# Altium integrated library Lib_MS_V4.0.IntLib: 296 symbols (part 1 of 2) (continued)
## IC_STM32H747IIT6 (continued)
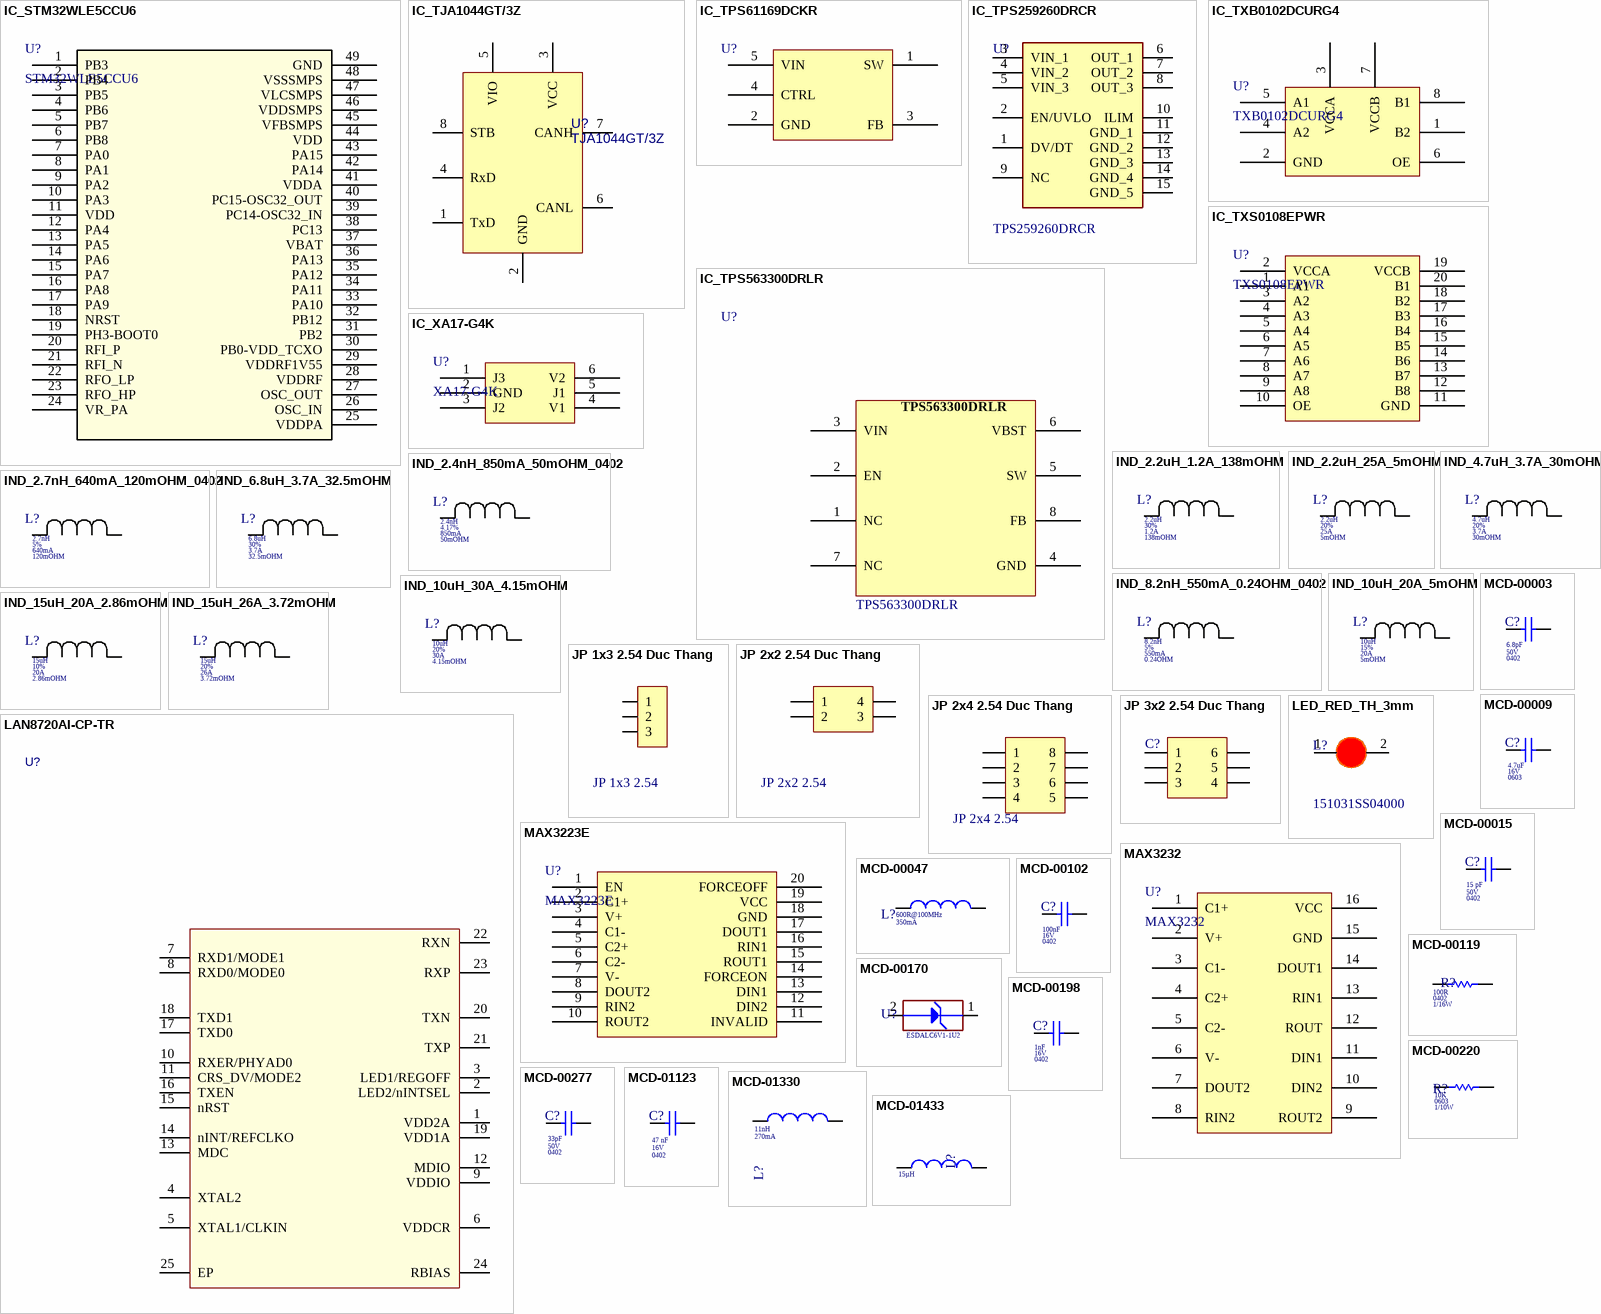
[diagram p5: symbols IC_STM32WLE5CCU6 to MCD-01433]

## IC_STM32WLE5CCU6
designator U?, comment STM32WLE5CCU6
IC RF TXRX+MCU 802.15.4 48UFQFPN; Sort: MCU; ComponentLink1Description: Link; ComponentLink1URL: https://www.digikey.bg/en/products/detail/stmicroelectronics/STM32WLE5CCU6/13557445; Datasheet: https://www.mouser.vn/datasheet/2/389/stm32wle5c8-1903151.pdf; Package: 48UFQFPN
footprint IC_STM32WLE5CCU6
pins: 1 PB3, 2 PB4, 3 PB5, 4 PB6, 5 PB7, 6 PB8, 7 PA0, 8 PA1, 9 PA2, 10 PA3, 11 VDD, 12 PA4, 13 PA5, 14 PA6, 15 PA7, 16 PA8, 17 PA9, 18 NRST, 19 PH3-BOOT0, 20 RFI_P, 21 RFI_N, 22 RFO_LP, 23 RFO_HP, 24 VR_PA, 25 VDDPA, 26 OSC_IN, 27 OSC_OUT, 28 VDDRF, 29 VDDRF1V55, 30 PB0-VDD_TCXO, 31 PB2, 32 PB12, 33 PA10, 34 PA11, 35 PA12, 36 PA13, 37 VBAT, 38 PC13, 39 PC14-OSC32_IN, 40 PC15-OSC32_OUT, 41 VDDA, 42 PA14, 43 PA15, 44 VDD, 45 VFBSMPS, 46 VDDSMPS, 47 VLCSMPS, 48 VSSSMPS, 49 GND

## IC_TJA1044GT/3Z
designator U?, comment TJA1044GT/3Z
1/1 Transceiver Half CANbus 8-SO; Manufacturer: ON Semiconductor; Point: 8; Description SEL: IC TRANSCEIVER HALF 1/1 8SO; Part Number: TJA1044GT/3Z; ComponentLink1Description: DIGIKEY; ComponentLink1URL: https://www.digikey.bg/en/products/detail/nxp-usa-inc/TJA1044GT-3Z/7648357?s=N4IgTCBcDaICoCkCCBGADAFgwcTgegGYAtEAXQF8g; Sort: TRANSCEIVER; Package: 8-SOIC
footprint IC_TJA1044GT/3Z
pins: 1 TxD, 2 GND, 3 VCC, 4 RxD, 5 VIO, 6 CANL, 7 CANH, 8 STB

## IC_TPS61169DCKR
designator U?, comment TPS61169DCKR  (value not drawn)
IC LED DRV RGLTR PWM 1.8A SC70-5; Sort: LED DRV; ComponentLink1Description: New link; ComponentLink1URL: https://www.digikey.bg/en/products/detail/texas-instruments/TPS61169DCKR/5048578?s=N4IgTCBcDaIC4AcDOA2AjGlBOAJgYwGsAnEAXQF8g; Package: SC70-5
footprint IC_TPS61169DCKR - duplicate
pins: 1 SW, 2 GND, 3 FB, 4 CTRL, 5 VIN

## IC_TPS259260DRCR
designator U?, comment TPS259260DRCR
IC ELECTRONIC FUSE 15% 10VSON; ComponentLink1Description: New link; ComponentLink1URL: https://www.digikey.bg/en/products/detail/texas-instruments/TPS259260DRCR/5481851?s=N4IgTCBcDaICoAUDKYCsBOMA2ADAEQCUBhAkAXQF8g; Sort: ELECTRONIC FUSE; Package: 10VSON
footprint IC_TPS259260DRCR
pins: 1 DV/DT, 2 EN/UVLO, 3 VIN_1, 4 VIN_2, 5 VIN_3, 6 OUT_1, 7 OUT_2, 8 OUT_3, 9 NC, 10 ILIM, 11 GND_1, 12 GND_2, 13 GND_3, 14 GND_4, 15 GND_5

## IC_TPS563300DRLR
designator U?, comment TPS563300DRLR
IC REG BUCK ADJ 3A SOT583; Manufacture 1: Texas Instruments; Mouting Type: SMD; Packing: Reel; MSL: 1; Package: SOT-583; Sort: IC REG BUCK; Temperature: -40°C ~ 150°C; ComponentLink1Description: New link; ComponentLink1URL: https://www.digikey.com/en/products/detail/texas-instruments/TPS563300DRLR/16669318?s=N4IgTCBcDaICoAUDKBWAbAZgwBmwEQCUAZAkAXQF8g; Type: REG BUCK; Manufacture Part Number 1: TPS563300DRLR
footprint IC_TPS563300DRLR
pins: 1 NC, 2 EN, 3 VIN, 4 GND, 5 SW, 6 VBST, 7 NC, 8 FB

## IC_TXB0102DCURG4
designator U?, comment TXB0102DCURG4
IC TRANSLTR BIDIRECTIONAL 8VSSOP; ComponentLink1Description: New link; ComponentLink1URL: https://linhkien.cxtvn.com/6065-txb0102dcur-ic-trnsltr-bidirectional-8-vssop.html; ComponentLink2Description: New link 1; ComponentLink2URL: https://www.digikey.com/en/products/detail/texas-instruments/TXB0102DCURG4/1910148; Sort: TRANSLTR BIDIRECTIONAL; Package: 8VSSOP
footprint IC_TXB0102DCURG4
pins: 1 B2, 2 GND, 3 VCCA, 4 A2, 5 A1, 6 OE, 7 VCCB, 8 B1

## IC_TXS0108EPWR
designator U?, comment TXS0108EPWR
IC TRANSLATOR BIDIR 20TSSOP; ComponentLink1Description: New link; ComponentLink1URL: https://linhkien.cxtvn.com/5101-txs0108epwr-ic-translator-bidirectional-60mbps-20-tssop.html; ComponentLink2Description: New link 1; ComponentLink2URL: https://www.digikey.com/en/products/detail/texas-instruments/TXS0108EPWR/1775302; Sort: TRANSLATOR BIDIR; Package: 20TSSOP
footprint IC_TXS0108EPWR
pins: 1 A1, 2 VCCA, 3 A2, 4 A3, 5 A4, 6 A5, 7 A6, 8 A7, 9 A8, 10 OE, 11 GND, 12 B8, 13 B7, 14 B6, 15 B5, 16 B4, 17 B3, 18 B2, 19 VCCB, 20 B1

## IC_XA17-G4K
designator U?, comment XA17-G4K
20MHz~4GHz 25dB 0.7dB SOT-363 RF Switches ROHS; ComponentLink1Description: LCSC; ComponentLink1URL: https://www.lcsc.com/product-detail/RF-Switches_XINLUDA-XA17-G4K_C513494.html; Sort: RF Switch; Package: SOT-363
footprint IC_XA17-G4K
pins: 1 J3, 2 GND, 3 J2, 4 V1, 5 J1, 6 V2

## IND_2.2uH_1.2A_138mOHM
designator L?, comment DCR: 138mOHM  Current: 1.2A  Tolerance: 30%  Inductance: 2.2uH  (hidden comment: LQM2MPN2R2NG0L)
2.2 µH Shielded Multilayer Inductor 1.2 A 138mOhm Max 0806 (2016 Metric); ComponentLink1Description: DIGIKEY; ComponentLink1URL: https://www.digikey.com/en/products/detail/murata-electronics/LQM2MPN2R2NG0L/4358099?s=N4IgTCBcDaIDIEUCyYkAUByYBKYMHEAGEAXQF8g
footprint IND_LQM2MPN2R2NG0L
pins: 1, 2

## IND_2.2uH_25A_5mOHM
designator L?, comment DCR: 5mOHM  Current: 25A  Tolerance: 20%  Inductance: 2.2uH  (hidden comment: NRS8040T6R8NJGJ)
2.2 µH Shielded Wirewound Inductor 25 A 5mOhm Max Nonstandard; ComponentLink1Description: DIGIKEY; ComponentLink1URL: https://www.digikey.com/en/products/detail/bourns-inc/SRP1245CC-2R2M/21263788
footprint IND_SRP1245CC-2R2M
pins: 1, 2

## IND_2.4nH_850mA_50mOHM_0402
designator L?, comment DCR: 50mOHM  Current: 850mA  Tolerance: 4.17%  Inductance: 2.4nH  (hidden comment: LQW15AN2N4B00D)
2.4 nH Unshielded Drum Core, Wirewound Inductor 850 mA 50mOhm Max 0402 (1005 Metric); ComponentLink1Description: New link; ComponentLink1URL: https://www.digikey.com/en/products/detail/murata-electronics/LQW15AN2N4B00D/2594882
footprint IND_0402
pins: 1, 2

## IND_2.7nH_640mA_120mOHM_0402
designator L?, comment DCR: 120mOHM  Current: 640mA  Tolerance: 5%  Inductance: 2.7nH  (hidden comment: CS0402-2N7J-S)
640mA 2.7nH ±5% 120mΩ 0402 Inductors (SMD) ROHS; ComponentLink1Description: New link; ComponentLink1URL: https://www.lcsc.com/product-detail/Inductors-SMD_Chilisin-Elec-CS0402-2N7J-S_C142181.html
footprint IND_0402
pins: 1, 2

## IND_4.7uH_3.7A_30mOHM
designator L?, comment DCR: 30mOHM  Current: 3.7A  Tolerance: 20%  Inductance: 4.7uH  (hidden comment: SDR0805-4R7ML)
4.7 µH Unshielded Drum Core, Wirewound Inductor 3.7 A 30mOhm Max Nonstandard; ComponentLink1Description: New link; ComponentLink1URL: https://www.digikey.com/en/products/detail/bourns-inc/SDR0805-4R7ML/2352815
footprint SDR0805-4R7ML
pins: 1, 2

## IND_6.8uH_3.7A_32.5mOHM
designator L?, comment DCR: 32.5mOHM  Current: 3.7A  Tolerance: 30%  Inductance: 6.8uH  (hidden comment: NRS8040T6R8NJGJ)
6.8 µH Shielded Drum Core, Wirewound Inductor 3.7 A 32.5mOhm Max Nonstandard; ComponentLink1Description: New link; ComponentLink1URL: https://www.digikey.gr/en/products/detail/taiyo-yuden/NRS8040T6R8NJGJ/2666017
footprint IND_8x8x4
pins: 1, 2

## IND_8.2nH_550mA_0.24OHM_0402
designator L?, comment DCR: 0.24OHM  Current: 550mA  Tolerance: 5%  Inductance: 8.2nH  (hidden comment: LQG15HS8N2J02D)
8.2 nH Unshielded Multilayer Inductor 550 mA 240mOhm Max 0402 (1005 Metric); ComponentLink1Description: New link; ComponentLink1URL: https://www.digikey.com/en/products/detail/murata-electronics/LQG15HS8N2J02D/662871
footprint IND_0402
pins: 1, 2

## IND_10uH_20A_5mOHM
designator L?, comment DCR: 5mOHM  Current: 20A  Tolerance: 15%  Inductance: 10uH  (hidden comment: HCTI-10-20.0)
10 µH Shielded Toroidal Inductor 20 A 5mOhm Max Radial, Vertical (Open); ComponentLink1Description: DIGIKEY; ComponentLink1URL: https://www.digikey.com/en/products/detail/signal-transformer/HCTI-10-20-0/7362968
footprint IND_HCTI-10-20.0
pins: 1, 2

## IND_10uH_30A_4.15mOHM
designator L?, comment DCR: 4.15mOHM  Current: 30A  Tolerance: 20%  Inductance: 10uH  (hidden comment: SRP2313AA-100M)
10 µH Shielded Drum Core, Wirewound Inductor 30 A 4.15mOhm Max Nonstandard; ComponentLink1Description: DIGIKEY; ComponentLink1URL: https://www.digikey.com/en/products/detail/bourns-inc/SRP2313AA-100M/7785075
footprint IND_SRP2313AA-100M
pins: 1, 2

## IND_15uH_20A_2.86mOHM
designator L?, comment DCR: 2.86mOHM  Current: 20A  Tolerance: 10%  Inductance: 15uH  (hidden comment: SER2918H-153KL)
15 µH Shielded Inductor 20 A 2.86mOhm Max Nonstandard; ComponentLink1Description: DIGIKEY; ComponentLink1URL: https://www.digikey.com/en/products/detail/coilcraft/SER2918H-153KL/15794217
footprint IND_SER2918H-153KL
pins: 1, 2

## IND_15uH_26A_3.72mOHM
designator L?, comment DCR: 3.72mOHM  Current: 26A  Tolerance: 20%  Inductance: 15uH  (hidden comment: CPEX2020A-150MC)
15 µH Shielded Wirewound Inductor 26 A 3.72mOhm Max Nonstandard Flat Wire, High Current, Soft Saturation; ComponentLink1Description: DIGIKEY; ComponentLink1URL: https://www.digikey.com/en/products/detail/codaca/CPEX2020A-150MC/16731475
footprint IND_CPEX2020A-150MC
pins: 1, 2

## JP 1x3 2.54 Duc Thang
designator JP?, comment JP 1x3 2.54
Cắm; Ten_Linh_Kien: Jump Đơn Đực 2.54MM 1x40P Thẳng 11MM; Don_Vi: Con; Chung_Loai: Cắm; ComponentLink1Description: New link; ComponentLink1URL: https://linhkien.cxtvn.com/8384-jump-duc-don-254mm-thang.html
footprint JP 1x3 DT
pins: 1, 2, 3

## JP 2x2 2.54 Duc Thang
designator JP?, comment JP 2x2 2.54
Cắm; Ten_Linh_Kien: Jump Đôi Đực 2.54MM 2x40P Thẳng 11MM; Don_Vi: Con; ComponentLink1Description: New link; ComponentLink1URL: https://linhkien.cxtvn.com/7795-jump-duc-doi-254mm-chan-thang.html
footprint JP 2x2 DT
pins: 1, 2, 3, 4

## JP 2x4 2.54 Duc Thang
designator JP?, comment JP 2x4 2.54
Cắm; Ten_Linh_Kien: Jump Đôi Đực 2.54MM 2x40P Thẳng 11MM; Don_Vi: Con; ComponentLink1Description: New link; ComponentLink1URL: https://linhkien.cxtvn.com/4767-jump-duc-doi-254mm-chan-thang.html
footprint JP 2X4 DT
pins: 1, 2, 3, 4, 5, 6, 7, 8

## JP 3x2 2.54 Duc Thang
designator C?, comment JP3x2  (value not drawn)
WR-PHD 2.54 mm Dual Socket Header; Manufacturer: W¨¹rth Elektronik eiSos GmbH; ComponentLink1 Description: Manufacturer; ComponentLink2 Description: Datasheet; NoPins: 06; ComponentLink1URL: https://linhkien.cxtvn.com/4688-jump-duc-doi-254mm-chan-thang.html; ComponentLink2URL: http://katalog.we-online.de/em/datasheet/6130xx21821.pdf; ComponentLink1Description: New link; ComponentLink1URL: *
footprint JP3-D2T (6 pins, dual pin, straight, gold plating)
pins: 1, 2, 3, 4, 5, 6

## LAN8720AI-CP-TR
designator U?  (value not drawn)
2/2 Transceiver Full MII, RMII 24-SQFN (4x4); Manufacturer: SMSC; Manufacturer Part Number: LAN8720AI-CP-TR; LCSC Part Number: C17146; Package: QFN-24_4x4x05P; ComponentLink1Description: CXT; ComponentLink1URL: https://linhkien.cxtvn.com/1660-lan8720ai-cp-tr-ic-transceiver-full-22-24sqfn.html; ComponentLink2Description: DIGIKEY; ComponentLink2URL: https://www.digikey.bg/en/products/detail/microchip-technology/LAN8720AI-CP-TR/3872110; Sort: TRANSCEIVER
footprint IC_LAN8720AI-CP-TR
pins: 1 VDD2A, 2 LED2/nINTSEL, 3 LED1/REGOFF, 4 XTAL2, 5 XTAL1/CLKIN, 6 VDDCR, 7 RXD1/MODE1, 8 RXD0/MODE0, 9 VDDIO, 10 RXER/PHYAD0, 11 CRS_DV/MODE2, 12 MDIO, 13 MDC, 14 nINT/REFCLKO, 15 nRST, 16 TXEN, 17 TXD0, 18 TXD1, 19 VDD1A, 20 TXN, 21 TXP, 22 RXN, 23 RXP, 24 RBIAS, 25 EP

## LED_RED_TH_3mm
designator L?, comment 151031SS04000
Red 635nm LED Indication - Discrete 2V Radial; Manufacturer: Würth Elektronik; Current - Test: 20mA; Ten_Linh_Kien: Led 3MM Phủ Đỏ (10c); Part Number: 151031SS04000; Voltage - Forward: 2V; Package: 3mm; ComponentLink1Description: New link; ComponentLink1URL: *; ComponentLink2Description: DIGIKEY; ComponentLink2URL: https://www.digikey.bg/en/products/detail/w%C3%BCrth-elektronik/151031SS04000/4489979
footprint LED-3MM-RED
pins: 1 A, 2 K

## MAX3223E
designator U?
3- to 5.5-V dual channel 500kbps RS-232 line driver/receiver with +/-15-kV IEC-ESD protection; Sort: IC TRANSCEIVER; Package: SOIC; ComponentLink1Description: DIGIKEY; ComponentLink1URL: https://www.digikey.bg/en/products/detail/texas-instruments/MAX3223EIPWR/1120535
footprint MAX3223E_SOIC
pins: 1 EN, 2 C1+, 3 V+, 4 C1-, 5 C2+, 6 C2-, 7 V-, 8 DOUT2, 9 RIN2, 10 ROUT2, 11 INVALID, 12 DIN2, 13 DIN1, 14 FORCEON, 15 ROUT1, 16 RIN1, 17 DOUT1, 18 GND, 19 VCC, 20 FORCEOFF

## MAX3232
designator U?
3-V to 5.5-V Multichannel RS-232 Line Driver and Receiver / With ±15-kV ESD Protection; Sort: IC TRANSCEIVER; ComponentLink1Description: New link; ComponentLink1URL: https://banlinhkien.com/max232-sop16-p6648577.html; Package: SOP16
footprint MAX232_SOP16
pins: 1 C1+, 2 V+, 3 C1-, 4 C2+, 5 C2-, 6 V-, 7 DOUT2, 8 RIN2, 9 ROUT2, 10 DIN2, 11 DIN1, 12 ROUT, 13 RIN1, 14 DOUT1, 15 GND, 16 VCC

## MCD-00003
designator C?, comment value 6.8pF  Package: 0402  Voltage: 50V  (hidden comment: Capacitor)
Capacitor, MLCC, 6.8pF, 50V, NPO, +-0.1pF, 0402, T=0.5mm; Manufacturer_Part_Number: GRM1555C1H6R8BA01; Manufacturer: MURATA
footprint CAPC1005X06N (Chip Capacitor, 2-Leads, Body 1.00x0.50x0.60mm (0402))
pins: 1, 2

## MCD-00009
designator C?  value 4.7uF  Package: 0603  Voltage: 16V
Capacitor, MLCC, 4.7uF, 16V, X5R, 10%, 0603, T=0.8mm; Manufacturer_Part_Number: CC0603KRX5R7BB475; Manufacturer: YAGEO
footprint CAPC1608X09N (Chip Capacitor, 2-Leads, Body 1.60x0.80x0.90mm (0603))
pins: 1, 2

## MCD-00015
designator C?  value 15 pF  Package: 0402  Voltage: 50V
Condensateurs céramique multicouches MLCC - CMS 0402 3.3pF 50Volts C0G +/-0.05pF; Manufacturer_Part_Number: GJM1555C1H150JB01; Manufacturer: MURATA
footprint CAPC1005X06N (Chip Capacitor, 2-Leads, Body 1.00x0.50x0.60mm (0402))
pins: 1, 2

## MCD-00047
designator L?  value 600R@100MHz  L: 350mA
SMD Chip ferrite bead, 600R@100MHz +/-25%, 350mA, 500mohm DC, 0603, T=0.8mm; Manufacturer_Part_Number: FCM1608KF-601T03; Manufacturer: TAI-TECH
footprint INDC1608X95N (Chip Inductor, 2-Leads, Body 1.75x0.95x0.95mm (0603))
pins: 1, 2

## MCD-00102
designator C?  value 100nF  Voltage: 16V  Package: 0402
Capacitor, MLCC, 100nF, 16V, X7R, 10%, 0402, T=0,5mm; Manufacturer_Part_Number: CC0402KRX7R7BB104; Manufacturer: YAGEO
footprint CAPC1005X06N (Chip Capacitor, 2-Leads, Body 1.00x0.50x0.60mm (0402))
pins: 1, 2

## MCD-00119
designator R?  value 100R  Power: 1/16W  Package: 0402
Resistor,100R,0402,1%,1/16W; Manufacturer_Part_Number: RC0402FR-07100RL; Manufacturer: YAGEO
footprint RESC1005X04N (Chip Resistor, 2-Leads, Body 1.00x0.50mm (0402))
pins: 1, 2

## MCD-00170
designator U?  Manufacturer_Part_Number: ESDALC6V1-1U2
ESD protection 6V1; Manufacturer: STMICROELECTRONICS
footprint DIOM0603X03N (Footprint not found)
pins: 1 IO1, 2 GND

## MCD-00198
designator C?  value 1nF  Voltage: 16V  Package: 0402
Capacitor, MLCC, 1nF, 16V, X7R, 10%, 0402, T=0.5mm; Manufacturer_Part_Number: CC0402KRX7R7BB102; Manufacturer: YAGEO
footprint CAPC1005X06N (Chip Capacitor, 2-Leads, Body 1.00x0.50x0.60mm (0402))
pins: 1, 2

## MCD-00220
designator R?  value 10K  Power: 1/10W  Package: 0603
Resistor,10K,0603,1%,1/10W; Manufacturer_Part_Number: RC0603FR-0710KL; Manufacturer: YAGEO
footprint RESC1608X05N (Chip Resistor, 2-Leads, Body 1.60x0.80mm (0603))
pins: 1, 2

## MCD-00277
designator C?  value 33pF  Voltage: 50V  Package: 0402
Capacitor, MLCC, 33pF, 50V, NPO, 2%, 0402, T=0,5mm; Manufacturer_Part_Number: GRM1555C1H330GA01; Manufacturer: MURATA
footprint CAPC1005X06N (Chip Capacitor, 2-Leads, Body 1.00x0.50x0.60mm (0402))
pins: 1, 2

## MCD-01123
designator C?  value 47 nF  Package: 0402  Voltage: 16V
Capacitor, MLCC,47nF, 16V, X7R, 10%, 0402, T=0.5mm; Manufacturer_Part_Number: GCM155R71E473KA55; Manufacturer: MURATA
footprint CAPC1005X06N (Chip Capacitor, 2-Leads, Body 1.00x0.50x0.60mm (0402))
pins: 1, 2

## MCD-01330
designator L?  value 11nH  L: 270mA
Inductor, 11 nH, +-0.1nH, 270mA, 0402; Manufacturer_Part_Number: LQW15AN11NG00D; Manufacturer: MURATA
footprint IND_MURATA_LQW15A (Inductor 2-Leads,Body 1.10x0.70x0.60mm(max))
pins: 1, 2

## MCD-01433
designator L?, comment value 15µH  (hidden comment: MLZ2012M150W)
MLZ2012 Multilayer Shielded Inductor 15µH, ±5%; Manufacturer: TDK; Manufacturer_Part_Number: MLZ2012M150W
footprint INDC2012X13N (Chip Inductor, 2-Leads, Body 2.0x1.2x1.3 (0805))
pins: 1, 2

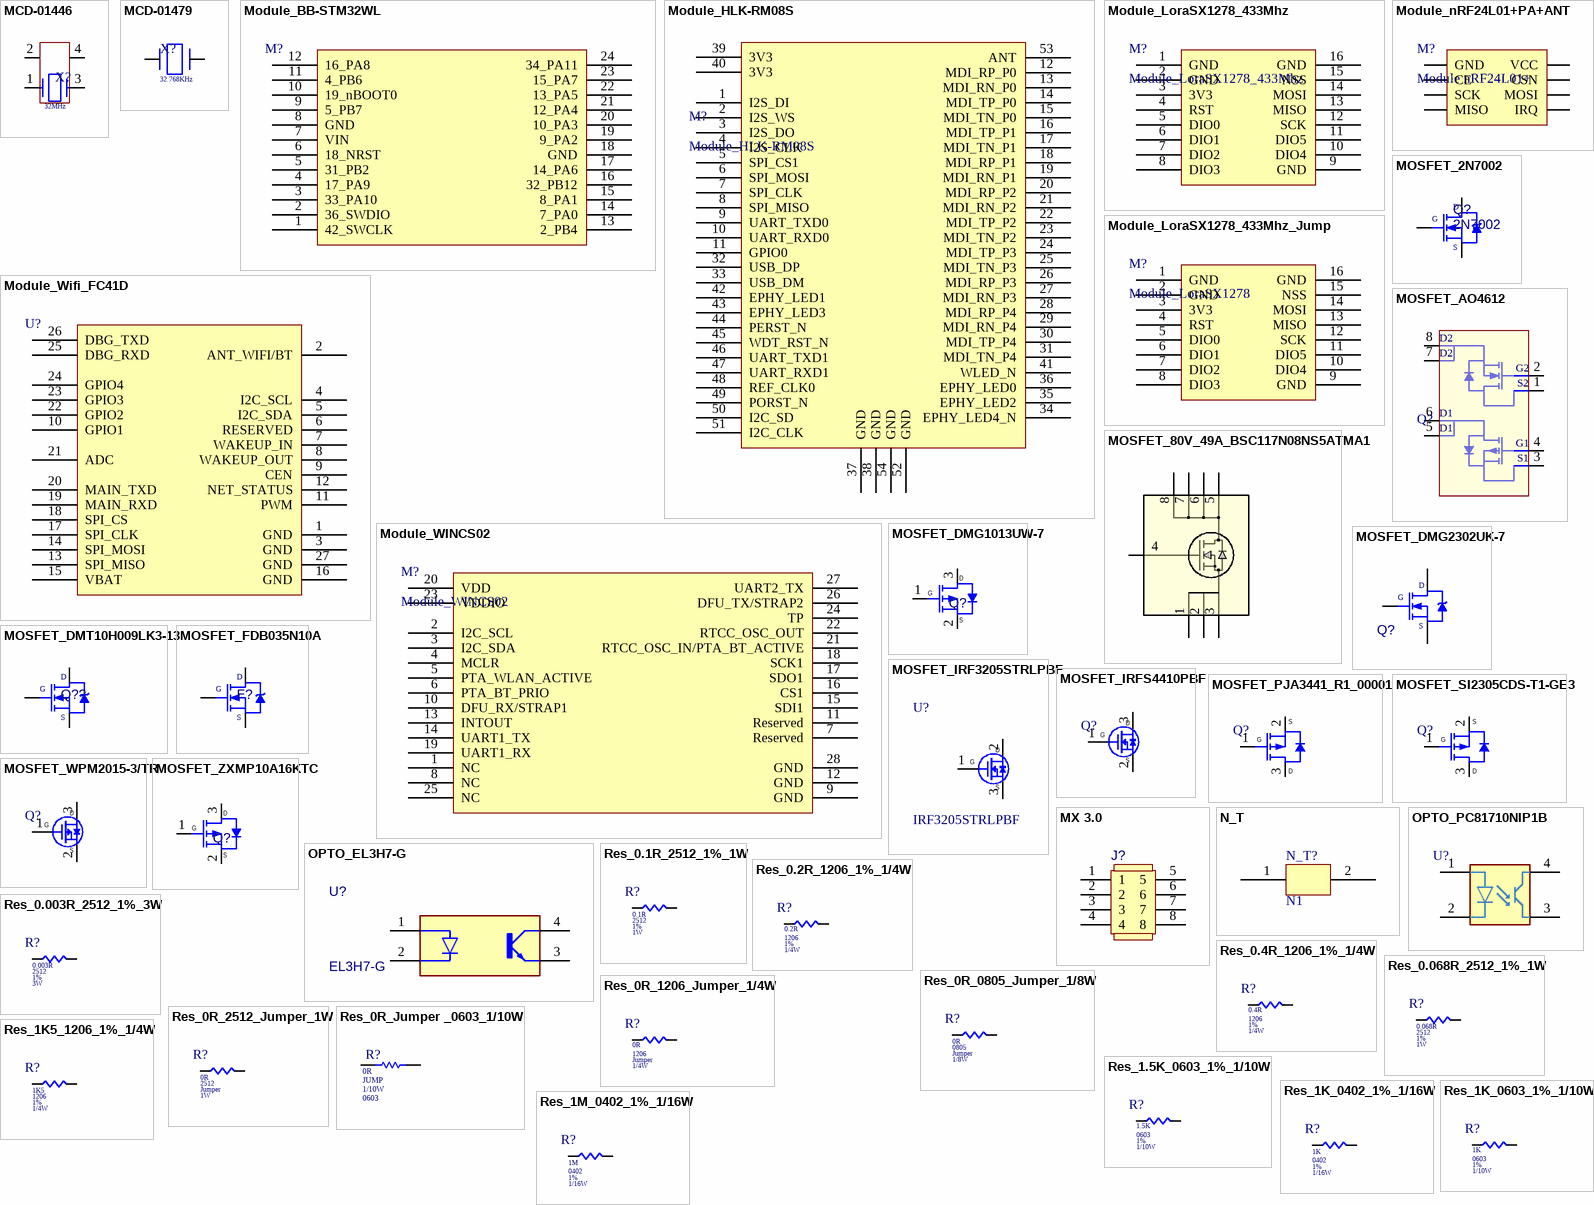
[diagram p6: symbols MCD-01446 to Res_1M_0402_1%_1/16W]

## MCD-01446
designator X?  value 32MHz
Crystal 32 MHz, 8pF, -+10 PPM, R=60Ω, SMD; Manufacturer_Part_Number: NX2016SA 32MHz EXS00A-CS06465; Manufacturer: NDK
footprint OSC_NDK_NX2016SA (Crystal, 4-Leads, Body 2.10x1.61x0.50mm (max), Pitch 1.35x1.05mm)
signal-integrity model Guessed Model (IC Model Details Guessed by Setup Helper)
pins: 1, 2, 3, 4

## MCD-01479
designator X?, comment value 32.768KHz  (hidden comment: XTAL_2_PINS)
Crystal 32.768kHz, 6pF, -+20PPM, R=80K, SMD; Manufacturer_Part_Number: NX2012SA 32.768KHz EXS00A-MU00527; Manufacturer: NDK
footprint OSC_NDK_NX2012SA (Crystal, 2-Leads, Body 2.05x1.20x0.55mm (Tol:-/+0.05))
pins: 1 X1, 2 X2

## Module_BB-STM32WL
designator M?  (value not drawn)
ComponentLink1Description: New link; ComponentLink1URL: https://www.digikey.bg/en/products/detail/olimex-ltd/BB-STM32WL-ANT/21662515?s=N4IgTCBcDaIEJwLQGUAqBZAzGA6gGRAF0BfIA; Datasheet: https://www.olimex.com/Products/IoT/LoRa/BB-STM32WL/resources/BB-STM32WL.pdf
footprint Module_BB-STM32WL-ANT
pins: 1 42_SWCLK, 2 36_SWDIO, 3 33_PA10, 4 17_PA9, 5 31_PB2, 6 18_NRST, 7 VIN, 8 GND, 9 5_PB7, 10 19_nBOOT0, 11 4_PB6, 12 16_PA8, 13 2_PB4, 14 7_PA0, 15 8_PA1, 16 32_PB12, 17 14_PA6, 18 GND, 19 9_PA2, 20 10_PA3, 21 12_PA4, 22 13_PA5, 23 15_PA7, 24 34_PA11

## Module_HLK-RM08S
designator M?
SMD,25.8x17.4mm WiFi Modules ROHS; ComponentLink1Description: New link; ComponentLink1URL: https://www.lcsc.com/product-detail/WiFi-Modules_HI-LINK-HLK-RM08S_C209918.html
footprint MODULE_HLK-RM08S
pins: 1 I2S_DI, 2 I2S_WS, 3 I2S_DO, 4 I2S_CLK, 5 SPI_CS1, 6 SPI_MOSI, 7 SPI_CLK, 8 SPI_MISO, 9 UART_TXD0, 10 UART_RXD0, 11 GPIO0, 12 MDI_RP_P0, 13 MDI_RN_P0, 14 MDI_TP_P0, 15 MDI_TN_P0, 16 MDI_TP_P1, 17 MDI_TN_P1, 18 MDI_RP_P1, 19 MDI_RN_P1, 20 MDI_RP_P2, 21 MDI_RN_P2, 22 MDI_TP_P2, 23 MDI_TN_P2, 24 MDI_TP_P3, 25 MDI_TN_P3, 26 MDI_RP_P3, 27 MDI_RN_P3, 28 MDI_RP_P4, 29 MDI_RN_P4, 30 MDI_TP_P4, 31 MDI_TN_P4, 32 USB_DP, 33 USB_DM, 34 EPHY_LED4_N, 35 EPHY_LED2, 36 EPHY_LED0, 37 GND, 38 GND, 39 3V3, 40 3V3, 41 WLED_N, 42 EPHY_LED1, 43 EPHY_LED3, 44 PERST_N, 45 WDT_RST_N, 46 UART_TXD1, 47 UART_RXD1, 48 REF_CLK0, 49 PORST_N, 50 I2C_SD, 51 I2C_CLK, 52 GND, 53 ANT, 54 GND